# Altium footprint library Sajad_Altium_Library.PcbLib: 380 footprints (part 18 of 24)
Each footprint in its own frame and in the unit in brackets; x right, y up, seen from the top. Pads: shape width x height; smd on the part's side, far side on the other; paste and mask are expansions set on the pad; w line width, h text height; cw(c..) or ccw(c..) is an arc to the next point about the centre after c.
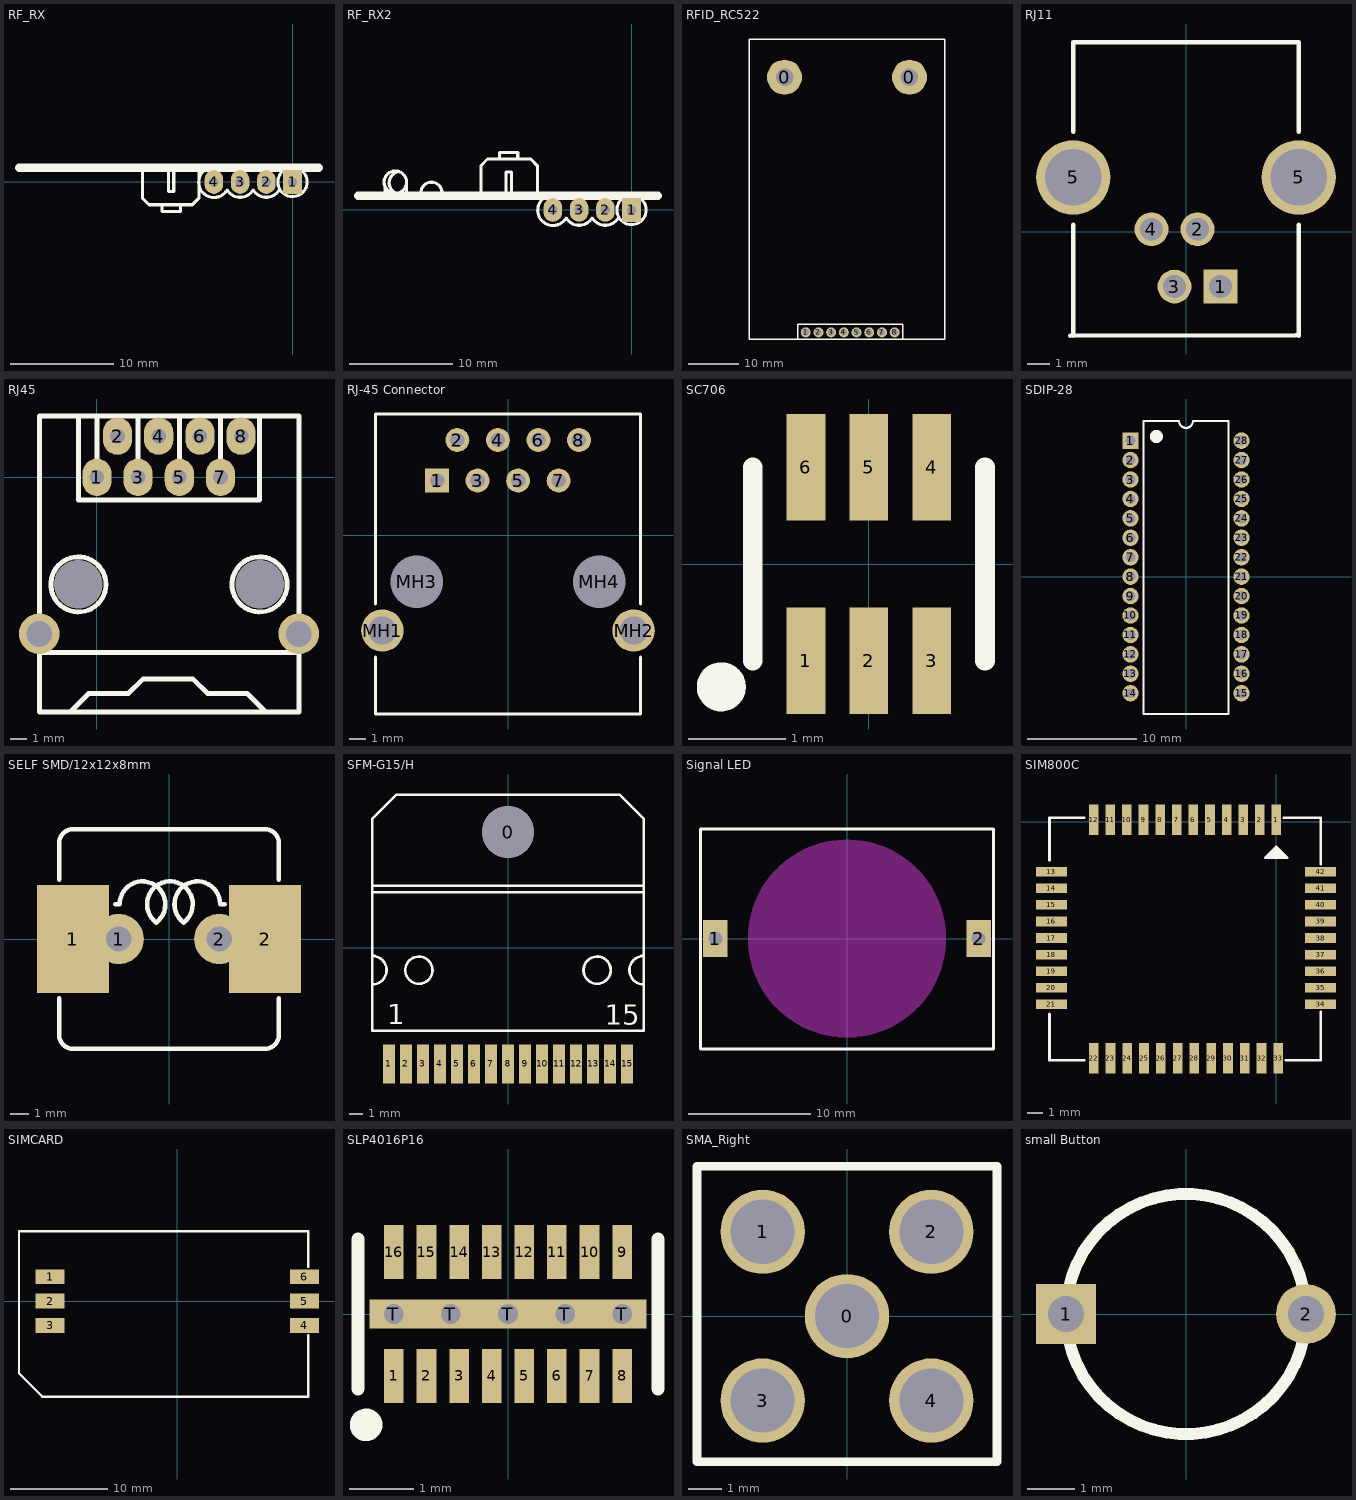
[diagram p17: the footprints below, top view; thin cyan lines are the x and y axes]

## RF_RX [mm]
pads (4):
  rect 1.8x2.3 hole 0.9: 1(0,0)
  oval 1.8x2.3 hole 0.9: 2(-2.54,0) 3(-5.08,0) 4(-7.62,0)
Top Overlay:
  circle w0.3: c0,0 r1.42
  lines w0.3: -14.529,1.473 -14.529,-1.575 -13.894,-2.21 -9.703,-2.21 -9.068,-1.575 -9.068,1.473 ; -12.624,-2.21 -12.624,-2.845 -10.846,-2.845 -10.846,-2.21 ; -12.014,1.473 -12.014,-0.94 -11.506,-0.94 -11.506,1.473 ; -6.836,1.242 ccw(c-7.606,-0.023) -6.336,-0.785 ; -6.35,-0.762 ccw(c-5.08,0) -3.81,-0.762 ccw(c-2.54,0) -1.27,-0.762
  lines w0.8: -26.492,1.372 2.565,1.372

## RF_RX2 [mm]
pads (4):
  rect 1.8x2.3 hole 0.9: 1(0,0)
  oval 1.8x2.3 hole 0.9: 2(-2.54,0) 3(-5.08,0) 4(-7.62,0)
Top Overlay:
  circle w0.3: c0,0 r1.42
  circle w0.305: c-22.878,2.692 r1.085
  lines w0.3: -23.894,1.499 -23.894,2.311 ; -21.793,1.568 -21.793,2.692 ; -14.58,1.245 -14.58,4.293 -13.945,4.928 -9.754,4.928 -9.119,4.293 -9.119,1.245 ; -12.802,4.928 -12.802,5.563 -11.024,5.563 -11.024,4.928 ; -12.141,1.245 -12.141,3.658 -11.633,3.658 -11.633,1.245 ; -6.836,1.242 ccw(c-7.606,-0.023) -6.336,-0.785 ; -6.35,-0.762 ccw(c-5.08,0) -3.81,-0.762 ccw(c-2.54,0) -1.27,-0.762
  lines w0.305: -22.518,1.551 cw(c-22.389,2.629) -22.497,3.708 ; -20.396,1.676 cw(c-19.38,1.676) -18.364,1.676
  lines w0.8: -26.492,1.372 2.565,1.372

## RFID_RC522 [mm]
height 0.55
pads (10):
  round 7 hole 3.5: 0(50.55,73.264) 0(75.55,73.264)
  round 2 hole 1.3: 1(54.794,22.225) 2(57.334,22.225) 3(59.874,22.225) 4(62.414,22.225) 5(64.954,22.225) 6(67.494,22.225) 7(70.034,22.225) 8(72.574,22.225)
Top Overlay:
  lines w0.254: 53.213,21.026 53.213,23.622 ; 53.213,23.566 53.213,23.876 74.168,23.876 74.168,23.439 ; 74.168,20.899 74.168,23.622 ; 43.55,20.899 82.55,20.899 82.55,80.899 43.55,80.899 43.55,20.899

## RJ11 [mm] "RJ11 CONNECTOR"
height 11.58
pads (6):
  rect 1.5x1.5 hole 1.016: 1(1.53,-2.42)
  round 1.5 hole 1.016: 2(0.51,0.12) 3(-0.51,-2.42) 4(-1.53,0.12)
  round 3.3 hole 2.5 unplated: 5(-5,2.42) 5(5,2.42)
Top Overlay:
  lines w0.2: -5.127,-4.611 4.873,-4.58 ; -5,-4.611 -5,0.326 ; -5,4.445 -5,8.42 5,8.42 5,4.445 ; 5,-4.611 5,0.326

## RJ45 [mm]
pads (12):
  oval 1.8x2.3 hole 0.9: 1(0,0) 2(1.27,2.54) 3(2.54,0) 4(3.81,2.54) 5(5.08,0) 6(6.35,2.54) 7(7.62,0) 8(8.89,2.54)
  round 2.5 hole 1.6: ""(-3.556,-9.652) ""(12.446,-9.652)
  round 2.54 hole 3: ""(-1.143,-6.604) ""(10.033,-6.604)
Top Overlay:
  circle w0.3: c10.033,-6.604 r1.7
  circle w0.3: c-1.143,-6.604 r1.7
  lines w0.305: -3.531,-10.795 12.471,-10.795 ; -1.651,-14.478 -0.508,-13.335 1.937,-13.335 2.826,-12.446 5.937,-12.446 6.826,-13.335 9.271,-13.335 10.414,-14.478 ; -1.143,3.785 -1.143,-1.397 10.033,-1.397 10.033,3.785 ; 0,0.381 0,3.785 ; 1.27,3.048 1.27,3.785 ; 2.54,0.381 2.54,3.785 ; 3.81,2.921 3.81,3.785 ; 5.08,0.381 5.08,3.785 ; 6.35,2.921 6.35,3.785 ; 7.62,0.381 7.62,3.785 ; 8.89,2.921 8.89,3.785 ; -3.531,-14.478 -3.531,3.785 12.471,3.785 12.471,-14.478 -3.531,-14.478

## RJ-45 Connector [mm] "LAN Conector"
pads (12):
  rect 1.5x1.5 hole 0.9: 1(-4.445,3.43)
  round 1.5 hole 0.9: 2(-3.175,5.97) 3(-1.905,3.43) 4(-0.635,5.97) 5(0.635,3.43) 6(1.905,5.97) 7(3.175,3.43) 8(4.445,5.97)
  round 2.65 hole 1.778: MH1(-7.875,-5.97) MH2(7.875,-5.97)
  round 2.95 hole 3.302 unplated: MH3(-5.715,-2.92) MH4(5.715,-2.92)
Top Overlay:
  lines w0.2: -8.3,-7.642 -8.3,-11.2 8.3,-11.2 8.3,-7.642 ; -8.3,-4.298 -8.3,7.6 8.3,7.6 8.3,-4.298

## SC706 [mm]
pads (6):
  rect 0.4x1.1 smd: 1(-0.65,-1) 2(0,-1) 3(0.65,-1) 4(0.65,1) 5(0,1) 6(-0.65,1)
Top Overlay:
  circle w0.254: c-1.524,-1.27 r0.127
  lines w0.203: -1.2,-1 -1.2,1 ; 1.2,-1 1.2,1

## SDIP-28 [mm] "DIP, Plastic, 28-Pin, Row Spacing 10.16 mm, Pitch 1.778 mm"
height 5.08
pads (28):
  rect 1.5x1.5 hole 0.9: 1(-5.08,12.446)
  round 1.5 hole 0.9: 2(-5.08,10.668) 3(-5.08,8.89) 4(-5.08,7.112) 5(-5.08,5.334) 6(-5.08,3.556) 7(-5.08,1.778) 8(-5.08,0) 9(-5.08,-1.778) 10(-5.08,-3.556) 11(-5.08,-5.334) 12(-5.08,-7.112) 13(-5.08,-8.89) 14(-5.08,-10.668) 15(5.08,-10.668) 16(5.08,-8.89) 17(5.08,-7.112) 18(5.08,-5.334) 19(5.08,-3.556) 20(5.08,-1.778) 21(5.08,0) 22(5.08,1.778) 23(5.08,3.556) 24(5.08,5.334) 25(5.08,7.112) 26(5.08,8.89) 27(5.08,10.668) 28(5.08,12.446)
Top Overlay:
  circle w0.6: c-2.713,12.827 r0.3
  lines w0.2: -3.9,-12.573 3.9,-12.573 3.9,14.25 0.635,14.25 cw(c0,14.25) -0.635,14.25 -3.9,14.25 -3.9,-12.573

## SELF SMD/12x12x8mm [mil]
pads (4):
  rect 157.48x236.22 smd: 1(-210,0) 2(210,0)
  round 110 hole 55: 1(-110,0) 2(110,0)
Top Overlay:
  lines w10: -240,-130 -240,-210 ccw(c-210,-210) -210,-240 210,-240 ccw(c210,-210) 240,-210 240,-130 ; -240,130 -240,210 cw(c-210,210) -210,240 210,240 cw(c210,210) 240,210 ; -118,76 -108,76 cw(c-58,76) -28,36 cw(c2,76) 32,36 cw(c62,76) 112,76 122,76 ; 240,130 240,210 ; 240,195 240,210

## SFM-G15/H [mm] "TO, SM, Horizontal, Heatsink Mounted; 15 Leads; Pitch 1.27 mm"
height 4.62
pads (16):
  round 3.86 hole 3.86: 0(0,8.66)
  rect 0.9x2.9 smd: 1(-8.89,-8.66) 2(-7.62,-8.66) 3(-6.35,-8.66) 4(-5.08,-8.66) 5(-3.81,-8.66) 6(-2.54,-8.66) 7(-1.27,-8.66) 8(0,-8.66) 9(1.27,-8.66) 10(2.54,-8.66) 11(3.81,-8.66) 12(5.08,-8.66) 13(6.35,-8.66) 14(7.62,-8.66) 15(8.89,-8.66)
Top Overlay:
  circle w0.2: c6.656,-1.656 r1.016
  circle w0.2: c-6.656,-1.656 r1.016
  lines w0.2: -10.135,-2.722 ccw(c-10.135,-1.656) -10.135,-0.59 ; -10.135,4.17 10.135,4.17 ; -10.135,4.64 10.135,4.64 ; 10.13,9.66 8.34,11.45 -8.34,11.45 -10.13,9.66 -10.135,9.66 -10.135,-6.18 10.135,-6.18 10.135,9.66 ; 10.135,-2.722 cw(c10.135,-1.656) 10.135,-0.59
  text "15" at 7.223,-5.741 h1.5
  text "1" at -9.012,-5.701 h1.5
3D body: height 5, standoff -1.5, extent -9.8,-12.167 9.8,11.433

## Signal LED [mm] "Signal_led"
pads (2):
  rect 2x3 hole 1.143: 1(-10.794,0) 2(10.794,0)
Top Overlay:
  lines w0.254: -12,-9.04 12,-9.04 12,8.96 -12,8.96 -12,-9.04
Keep-Out Layer:
  circle w0.254: c0,0 r8
  board cut-out: -8.013,0 -7.962,-0.897 -7.812,-1.783 -7.563,-2.646 -7.219,-3.477 -6.784,-4.263 -6.265,-4.996 -5.666,-5.666 -4.996,-6.265 -4.263,-6.784 -3.477,-7.219 -2.646,-7.563 -1.783,-7.812 -0.897,-7.962 0,-8.013 0.897,-7.962 1.783,-7.812 2.646,-7.563 3.477,-7.219 4.263,-6.784 4.996,-6.265 5.666,-5.666 6.265,-4.996 6.784,-4.263 7.219,-3.477 7.563,-2.646 7.812,-1.783 7.962,-0.897 8.013,0 7.962,0.897 7.812,1.783 7.563,2.646 7.219,3.477 6.784,4.263 6.265,4.996 5.666,5.666 4.996,6.265 4.263,6.784 3.477,7.219 2.646,7.563 1.783,7.812 0.897,7.962 0,8.013 -0.897,7.962 -1.783,7.812 -2.646,7.563 -3.477,7.219 -4.263,6.784 -4.996,6.265 -5.666,5.666 -6.265,4.996 -6.784,4.263 -7.219,3.477 -7.563,2.646 -7.812,1.783 -7.962,0.897

## SIM800C [mil]
height 21.65
pads (42):
  rect 25x80 smd: 1(0,5) 2(-43.18,5) 3(-86.36,5) 4(-129.55,5) 5(-172.73,5) 6(-215.91,5) 7(-259.09,5) 8(-302.27,5) 9(-345.45,5) 10(-388.64,5) 11(-431.82,5) 12(-475,5) 22(-475,-615) 23(-431.36,-615) 24(-387.73,-615) 25(-344.09,-615) 26(-300.45,-615) 27(-256.82,-615) 28(-213.18,-615) 29(-169.55,-615) 30(-125.91,-615) 31(-82.27,-615) 32(-38.64,-615) 33(5,-615)
  rect 80x25 smd: 13(-585,-130) 14(-585,-173.12) 15(-585,-216.25) 16(-585,-259.38) 17(-585,-302.5) 18(-585,-345.62) 19(-585,-388.75) 20(-585,-431.88) 21(-585,-475) 34(115,-475) 35(115,-431.88) 36(115,-388.75) 37(115,-345.62) 38(115,-302.5) 39(115,-259.38) 40(115,-216.25) 41(115,-173.12) 42(115,-130)
Top Overlay:
  lines w5: -27,-91 27,-91 ; -24,-88 24,-88 ; -21,-85 21,-85 ; -18,-82 18,-82 ; -15,-79 15,-79 ; -12,-76 12,-76 ; -9,-73 9,-73 ; -6,-70 6,-70 ; -3,-67 3,-67 ; -30,-94 29,-94 0,-64 -30,-94
  lines w7: -590,-500 -590,-620 -500,-620 ; -590,-100 -590,10 -500,10 ; 20,10 115,10 115,-110 ; 25,-620 115,-620 115,-495
3D body: height 87.85, standoff -4.27, extent -582.92,-613.11 110,5

## SIMCARD [mil]
pads (6):
  rect 118.11x60 smd: 1(-515,98.43) 2(-515,0) 3(-515,-98.43) 4(515,-98.43) 5(515,0) 6(515,98.43)
Top Overlay:
  lines w10: 530.65,-138 530.65,-387.43 -546,-387.43 -641,-292.43 -641,282.57 530.65,282.57 530.65,139
3D body: height 92.52, standoff -27.56, extent -638.65,-390.43 530.65,286.74

## SLP4016P16 [mil] "EClamp2410P  ESD Protection Device   for T-Flash/MicroSD Interfaces"
pads (22):
  rect 12x33 smd mask+2: 1(-70,-38) 2(-50,-38) 3(-30,-38) 4(-10,-38) 5(10,-38) 6(30,-38) 7(50,-38) 8(70,-38) 9(70,38) 10(50,38) 11(30,38) 12(10,38) 13(-10,38) 14(-30,38) 15(-50,38) 16(-70,38)
  round 15 hole 12 mask+2: T(-70,0) T(-35,0) T(0,0) T(35,0) T(70,0)
  rect 170x18 smd mask+2: T(0,0)
Top Overlay:
  circle w10: c-87,-68 r5
  lines w8: -92,-46 -92,46 ; 92,-46 92,46

## SMA_Right [mm]
pads (5):
  round 2.5 hole 1.9: 0(0,0) 1(-2.5,2.5) 2(2.5,2.5) 3(-2.5,-2.5) 4(2.5,-2.5)
Top Overlay:
  lines w0.254: -4.445,-4.318 -4.445,4.445 4.445,4.445 4.445,-4.318 -4.445,-4.318

## small Button [mil]
pads (2):
  rect 50x50 hole 30: 1(-100,0)
  round 50 hole 30: 2(100,0)
Top Overlay:
  circle w10: c0,0 r100
3D body: height 196.85, standoff -551.18, extent -118.1,-118.1 118.12,125.99